# Altium footprint library QUTMS-MCISOLibrary.PcbLib: 56 footprints (part 2 of 4)
Each footprint in its own frame and in the unit in brackets; x right, y up, seen from the top. Pads: shape width x height; smd on the part's side, far side on the other; paste and mask are expansions set on the pad; w line width, h text height; cw(c..) or ccw(c..) is an arc to the next point about the centre after c.
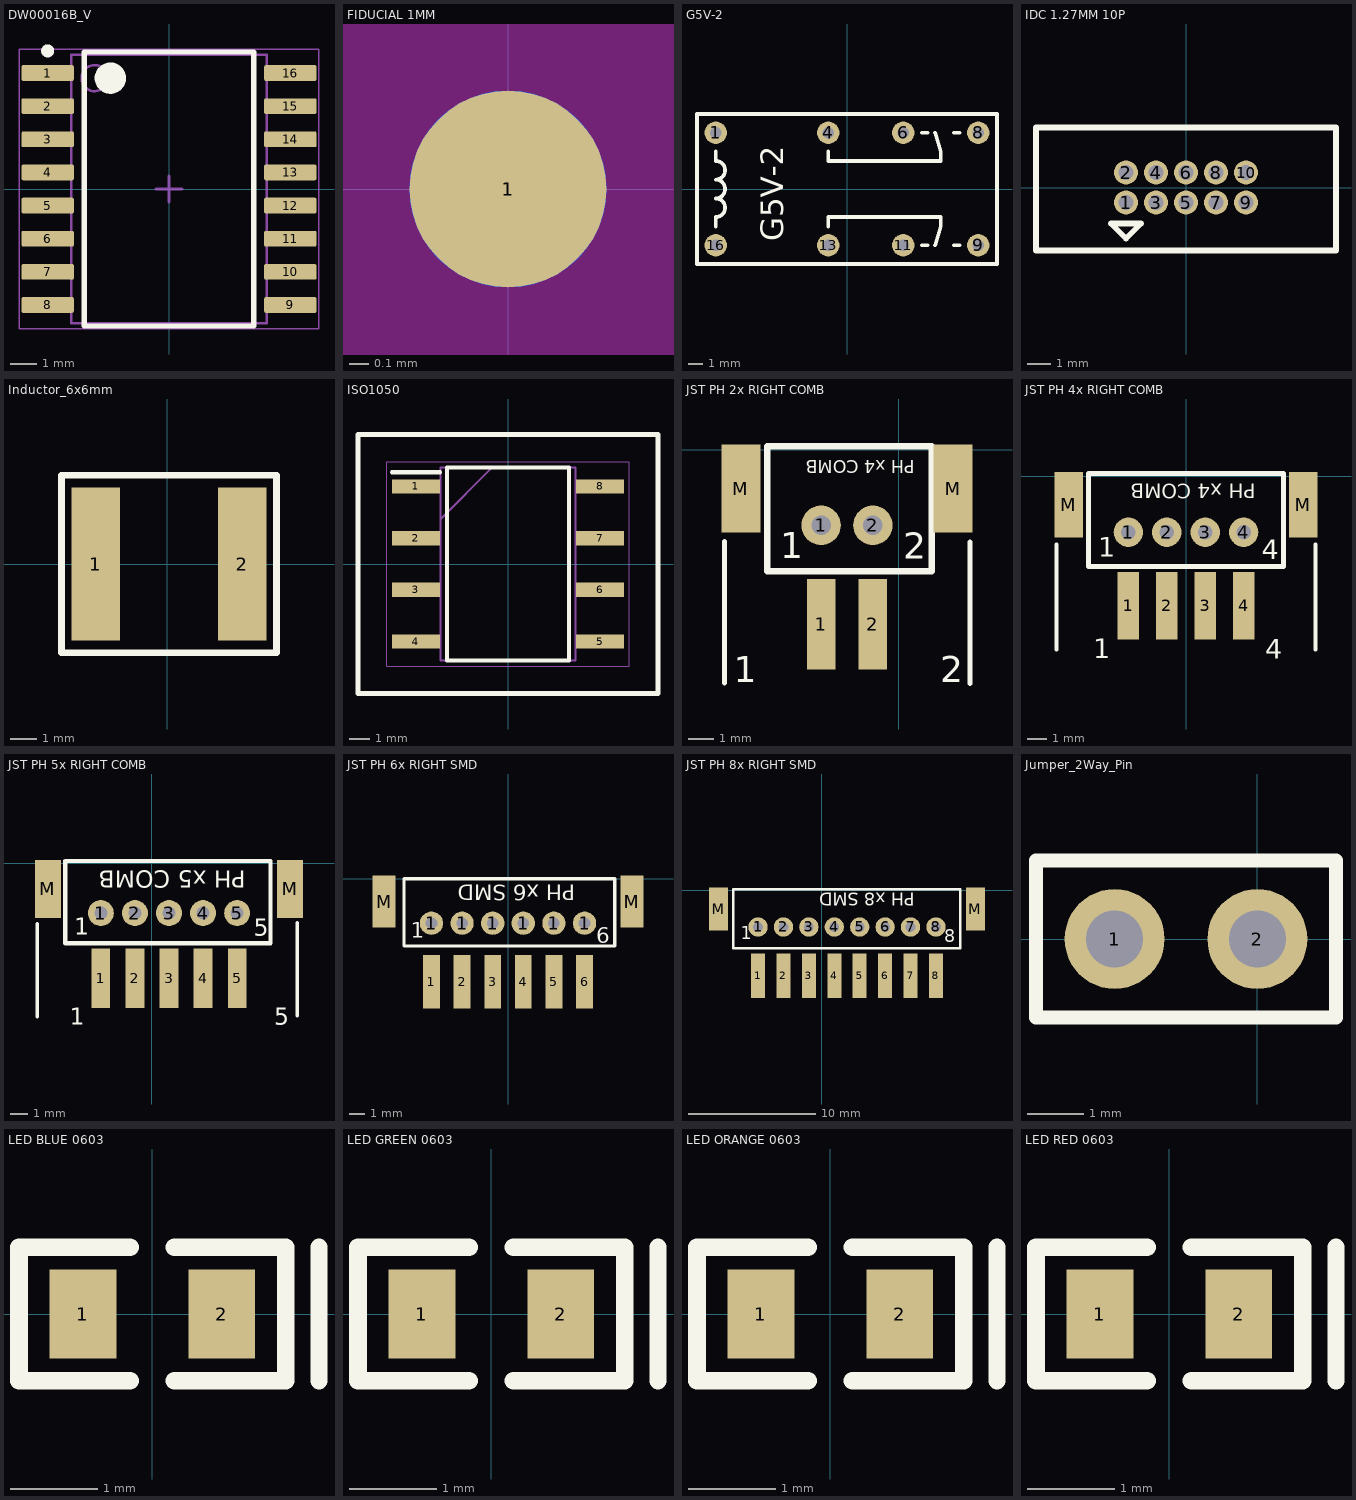
[diagram p1: the footprints below, top view; thin cyan lines are the x and y axes]

## DW00016B_V [mm] "SOIC, 16-Leads, Body 10.3x7.5mm, Pitch 1.27mm"
height 2.65
pads (16):
  rrect17% 2x0.6 smd: 1(-4.65,4.445) 2(-4.65,3.175) 3(-4.65,1.905) 4(-4.65,0.635) 5(-4.65,-0.635) 6(-4.65,-1.905) 7(-4.65,-3.175) 8(-4.65,-4.445) 9(4.65,-4.445) 10(4.65,-3.175) 11(4.65,-1.905) 12(4.65,-0.635) 13(4.65,0.635) 14(4.65,1.905) 15(4.65,3.175) 16(4.65,4.445)
Top Overlay:
  circle w0.25: c-4.65,5.295 r0.125
  circle w0.6: c-2.25,4.25 r0.3
  lines w0.2: -3.25,-5.25 -3.25,5.25 3.25,5.25 3.25,-5.25 -3.25,-5.25
Mechanical 1:
  text ".Designator" at -2.921,-0.381 h1
Mechanical 13:
  circle w0.1: c-2.85,4.25 r0.5
  lines w0.1: -3.75,-5.15 -3.75,5.15 3.75,5.15 3.75,-5.15 -3.75,-5.15
Mechanical 15:
  lines w0.05: -5.75,-5.35 -5.75,5.35 5.75,5.35 5.75,-5.35 -5.75,-5.35
  lines w0.1: -0.5,0 0.5,0 ; 0,-0.5 0,0.5
3D body "DW0016B.stp": height 2.59, standoff 0, extent -5.167,-5.15 5.168,5.15

## FIDUCIAL 1MM [mm]
pads (2):
  round 1 smd mask+1: 1(0,0)
  round 1 smd far side mask+1: 1(0,0)
Keep-Out Layer:
  circle w1.524: c0,0 r0.762

## G5V-2 [mil]
pads (8):
  round 60 hole 30: 1(-350,150) 4(-50,150) 6(150,150) 8(350,150) 9(350,-150) 11(150,-150) 13(-50,-150) 16(-350,-150)
Top Overlay:
  lines w10: -350,-100 -350,-75 ccw(c-350,-50) -350,-25 ccw(c-350,0) -350,25 ccw(c-350,50) -350,75 -350,100 ; -50,-100 -50,-75 250,-75 250,-100 235,-150 ; -50,100 -50,75 250,75 250,100 235,150 ; 200,-150 215,-150 ; 200,150 215,150 ; 285,-150 300,-150 ; 285,150 300,150 ; -400,-200 400,-200 400,200 -400,200 -400,-200
  text "G5V-2" at -170,-139.95 h60
3D body "G5V_2.step": height 452.76, standoff -137.8, extent -403.54,-198.81 403.55,198.83

## IDC 1.27MM 10P [mil]
pads (10):
  round 40 hole 25: 1(-100,-25) 2(-100,25) 3(-50,-25) 4(-50,25) 5(0,-25) 6(0,25) 7(50,-25) 8(50,25) 9(100,-25) 10(100,25)
Top Overlay:
  lines w10: -250,-105 250,-105 250,100 -250,100 -250,-105 ; -125,-60 -75,-60 -100,-85 -125,-60
3D body "CONB127P-2R-10W_TH.STEP": height 213.6, standoff -81.68, extent -249.01,-104.33 249.02,100.4

## Inductor_6x6mm [mm]
pads (2):
  rect 1.8x5.7 smd: 1(-2.667,0) 2(2.794,0)
Top Overlay:
  lines w0.254: -3.937,-3.302 4.064,-3.302 4.064,3.302 -3.937,3.302 -3.937,-3.302
3D body "74404064221_WE-LQS.stp": height 4.56, standoff 0.06, extent -3,-3 3,3

## ISO1050 [mm]
pads (8):
  rect 2.35x0.7 smd: 1(-4.525,3.81) 2(-4.525,1.27) 3(-4.525,-1.27) 4(-4.525,-3.81) 5(4.525,-3.81) 6(4.525,-1.27) 7(4.525,1.27) 8(4.525,3.81)
Top Overlay:
  lines w0.2: -5.7,4.51 -3.35,4.51 ; -3,-4.75 3,-4.75 3,4.75 -3,4.75 -3,-4.75
  lines w0.254: -7.373,-6.373 7.373,-6.373 7.373,6.373 -7.373,6.373 -7.373,-6.373
Mechanical 13:
  lines w0.1: -3.31,2.21 -0.77,4.75 ; -3.31,-4.75 3.31,-4.75 3.31,4.75 -3.31,4.75 -3.31,-4.75
Mechanical 15:
  lines w0.05: -5.95,-5.025 5.95,-5.025 5.95,5.025 -5.95,5.025 -5.95,-5.025
3D body "ISO1050DUBR.stp": height 4.85, standoff 0, extent -5.2,-4.75 5.2,4.75

## JST PH 2x RIGHT COMB [mm]
pads (6):
  rect 1.1x3.5 smd: 1(-3,-6.75) 2(-1,-6.75)
  round 1.524 hole 0.762: 1(-3,-2.921) 2(-1,-2.921)
  rect 1.5x3.4 smd: M(-6.1,-1.5) M(2.1,-1.5)
Top Overlay:
  lines w0.2: -6.731,-9.017 -6.731,-3.556 ; -4.953,0.127 1.1,0.127 ; 2.75,-9.036 2.75,-3.575
  lines w0.254: -5.08,-4.699 1.275,-4.699 1.275,0.127 -5.08,0.127 -5.08,-4.699
  text "2" at 1.602,-8.998 h1.02
  text "1" at -6.373,-8.998 h1.02
  text "PH x4 COMB" at 0.616,-0.402 h0.5
  text "2" at 0.177,-4.223 h1.02
  text "1" at -4.572,-4.191 h1.02
3D body "JST - PH - SMD (R) - 2Pin - 2.00mm.stp": height 5.38, standoff 0, extent -6.173,-8.025 1.973,0.23
3D body "JST - PH - Thru (V) - 2Pin - 2.00mm.stp": height 5.89, standoff -3.05, extent -4.88,-4.65 0.981,0.024

## JST PH 4x RIGHT COMB [mm]
pads (10):
  rect 1.1x3.5 smd: 1(-3,-6.75) 2(-1,-6.75) 3(1,-6.75) 4(3,-6.75)
  round 1.524 hole 0.762: 1(-3,-2.921) 2(-1,-2.921) 3(1,-2.921) 4(3,-2.921)
  rect 1.5x3.4 smd: M(-6.1,-1.5) M(6.1,-1.5)
Top Overlay:
  lines w0.2: -6.731,-9.017 -6.731,-3.556 ; -4.953,0.127 4.953,0.127 ; 6.731,-9.017 6.731,-3.556
  lines w0.254: -5.08,-4.699 -5.08,0.127 5.08,0.127 5.08,-4.699 -5.08,-4.699
  text "1" at -4.572,-4.191 h1.02
  text "4" at 3.937,-4.318 h1.02
  text "PH x4 COMB" at 3.624,-0.406 h0.75
  text "1" at -4.836,-9.477 h1.02
  text "4" at 4.109,-9.487 h1.02
3D body "JST - PH - Thru (V) - 4Pin - 2.00mm.stp": height 5.89, standoff -3.05, extent -4.931,-4.621 4.93,0.052
3D body "JST - PH - SMD (R) - 4Pin - 2.00mm.stp": height 5.38, standoff 0, extent -6.073,-8.2 6.073,0.055

## JST PH 5x RIGHT COMB [mm]
pads (12):
  rect 1.1x3.5 smd: 1(-3,-6.75) 2(-1,-6.75) 3(1,-6.75) 4(3,-6.75) 5(5,-6.75)
  round 1.524 hole 0.762: 1(-3,-2.921) 2(-1,-2.921) 3(1,-2.921) 4(3,-2.921) 5(5,-2.921)
  rect 1.5x3.4 smd: M(-6.1,-1.5) M(8.1,-1.5)
Top Overlay:
  lines w0.2: -6.731,-9.017 -6.731,-3.556 ; -4.953,0.127 4.953,0.127 ; 8.531,-8.942 8.531,-3.481
  lines w0.254: -5.08,-4.699 -5.08,0.127 6.95,0.127 6.95,-4.699 -5.08,-4.699
  text "1" at -4.572,-4.191 h1.02
  text "5" at 5.977,-4.248 h1.02
  text "PH x5 COMB" at 5.509,-0.427 h1.02
  text "1" at -4.836,-9.477 h1.02
  text "5" at 7.177,-9.473 h1.02
3D body "JST - PH - Thru (V) - 5Pin - 2.00mm.stp": height 5.89, standoff -3.05, extent -4.93,-4.621 6.931,0.053
3D body "JST - PH - SMD (R) - 5Pin - 2.00mm.stp": height 5.38, standoff 0, extent -5.998,-8.03 8.148,0.225

## JST PH 6x RIGHT SMD [mm]
pads (14):
  rect 1.1x3.5 smd: 1(-5,-6.75) 2(-3,-6.75) 3(-1,-6.75) 4(1,-6.75) 5(3,-6.75) 6(5,-6.75)
  round 1.524 hole 0.762: 1(-5,-2.91) 1(-3,-2.91) 1(-1,-2.91) 1(1,-2.91) 1(3,-2.91) 1(5,-2.91)
  rect 1.5x3.4 smd: M(-8.1,-1.5) M(8.1,-1.5)
Top Overlay:
  lines w0.2: -6.79,-4.39 6.973,-4.39 6.973,-0.01 -6.79,-0.01 -6.79,-4.39
  text "6" at 5.777,-4.223 h1.02
  text "1" at -6.348,-3.873 h1.02
  text "PH x6 SMD" at 4.401,-0.406 h1.02
3D body "JST - PH - Thru (V) - 6Pin - 2.00mm.stp": height 5.89, standoff -3.05, extent -6.955,-4.575 6.906,0.099
3D body "JST - PH - SMD (R) - 6Pin - 2.00mm.stp": height 5.38, standoff 0, extent -8.173,-8.225 7.973,0.03

## JST PH 8x RIGHT SMD [mm]
pads (18):
  rect 1.1x3.5 smd: 1(-5,-6.75) 2(-3,-6.75) 3(-1,-6.75) 4(1,-6.75) 5(3,-6.75) 6(5,-6.75) 7(7,-6.75) 8(9,-6.75)
  round 1.524 hole 0.762: 1(-5,-2.91) 2(-3,-2.91) 3(-1,-2.91) 4(1,-2.91) 5(3,-2.91) 6(5,-2.91) 7(7,-2.91) 8(9,-2.91)
  rect 1.5x3.4 smd: M(-8.1,-1.5) M(12.1,-1.5)
Top Overlay:
  lines w0.2: -6.95,-4.575 10.9,-4.575 10.9,0.075 -6.95,0.075 -6.95,-4.575
  text "PH x8 SMD" at 7.327,-0.225 h1.02
  text "1" at -6.348,-3.873 h1.02
  text "8" at 9.652,-4.098 h1.02
3D body "JST - PH - Thru (V) - 8Pin - 2.00mm.stp": height 5.89, standoff -3.05, extent -6.955,-4.575 10.906,0.099
3D body "JST - PH - SMD (R) - 8Pin - 2.00mm.stp": height 5.38, standoff 0, extent -8.122,-8.002 12.025,0.252

## Jumper_2Way_Pin [mil]
pads (2):
  round 70 hole 40: 1(-100,0) 2(0,0)
Top Overlay:
  lines w10: -155,-55 -155,55 55,55 55,-55 -155,-55
3D body "77311-y18-02_asm.stp": height 332.16, standoff -120.59, extent -142.38,-47.72 41.87,47.16

## LED BLUE 0603 [mil]
pads (2):
  rect 30x40 smd: 1(-31.24,0) 2(31.24,0)
Top Overlay:
  lines w7.87: 75,-30 75,30
  lines w8: -10,-30 -60,-30 -60,30 -10,30 ; 10,-30 60,-30 60,30 10,30
3D body: height 7, standoff 0, extent -40,-20 40,20
3D body: height 30, standoff 1, extent -30,-17.5 30,17.5

## LED GREEN 0603 [mil]
pads (2):
  rect 30x40 smd: 1(-31.24,0) 2(31.24,0)
Top Overlay:
  lines w7.87: 75,-30 75,30
  lines w8: -10,-30 -60,-30 -60,30 -10,30 ; 10,-30 60,-30 60,30 10,30
3D body: height 7, standoff 0, extent -40,-20 40,20
3D body: height 30, standoff 1, extent -30,-17.5 30,17.5

## LED ORANGE 0603 [mil]
pads (2):
  rect 30x40 smd: 1(-31.24,0) 2(31.24,0)
Top Overlay:
  lines w7.87: 75,-30 75,30
  lines w8: -10,-30 -60,-30 -60,30 -10,30 ; 10,-30 60,-30 60,30 10,30
3D body: height 30, standoff 1, extent -30,-17.5 30,17.5
3D body: height 7, standoff 0, extent -40,-20 40,20

## LED RED 0603 [mil]
pads (2):
  rect 30x40 smd: 1(-31.24,0) 2(31.24,0)
Top Overlay:
  lines w7.87: 75,-30 75,30
  lines w8: -10,-30 -60,-30 -60,30 -10,30 ; 10,-30 60,-30 60,30 10,30
3D body: height 30, standoff 1, extent -30,-17.5 30,17.5
3D body: height 7, standoff 0, extent -40,-20 40,20